# Altium footprint library Reflow3D1411sep.PcbLib: 657 footprints (part 32 of 42)
Each footprint in its own frame and in the unit in brackets; x right, y up, seen from the top. Pads: shape width x height; smd on the part's side, far side on the other; paste and mask are expansions set on the pad; w line width, h text height; cw(c..) or ccw(c..) is an arc to the next point about the centre after c.
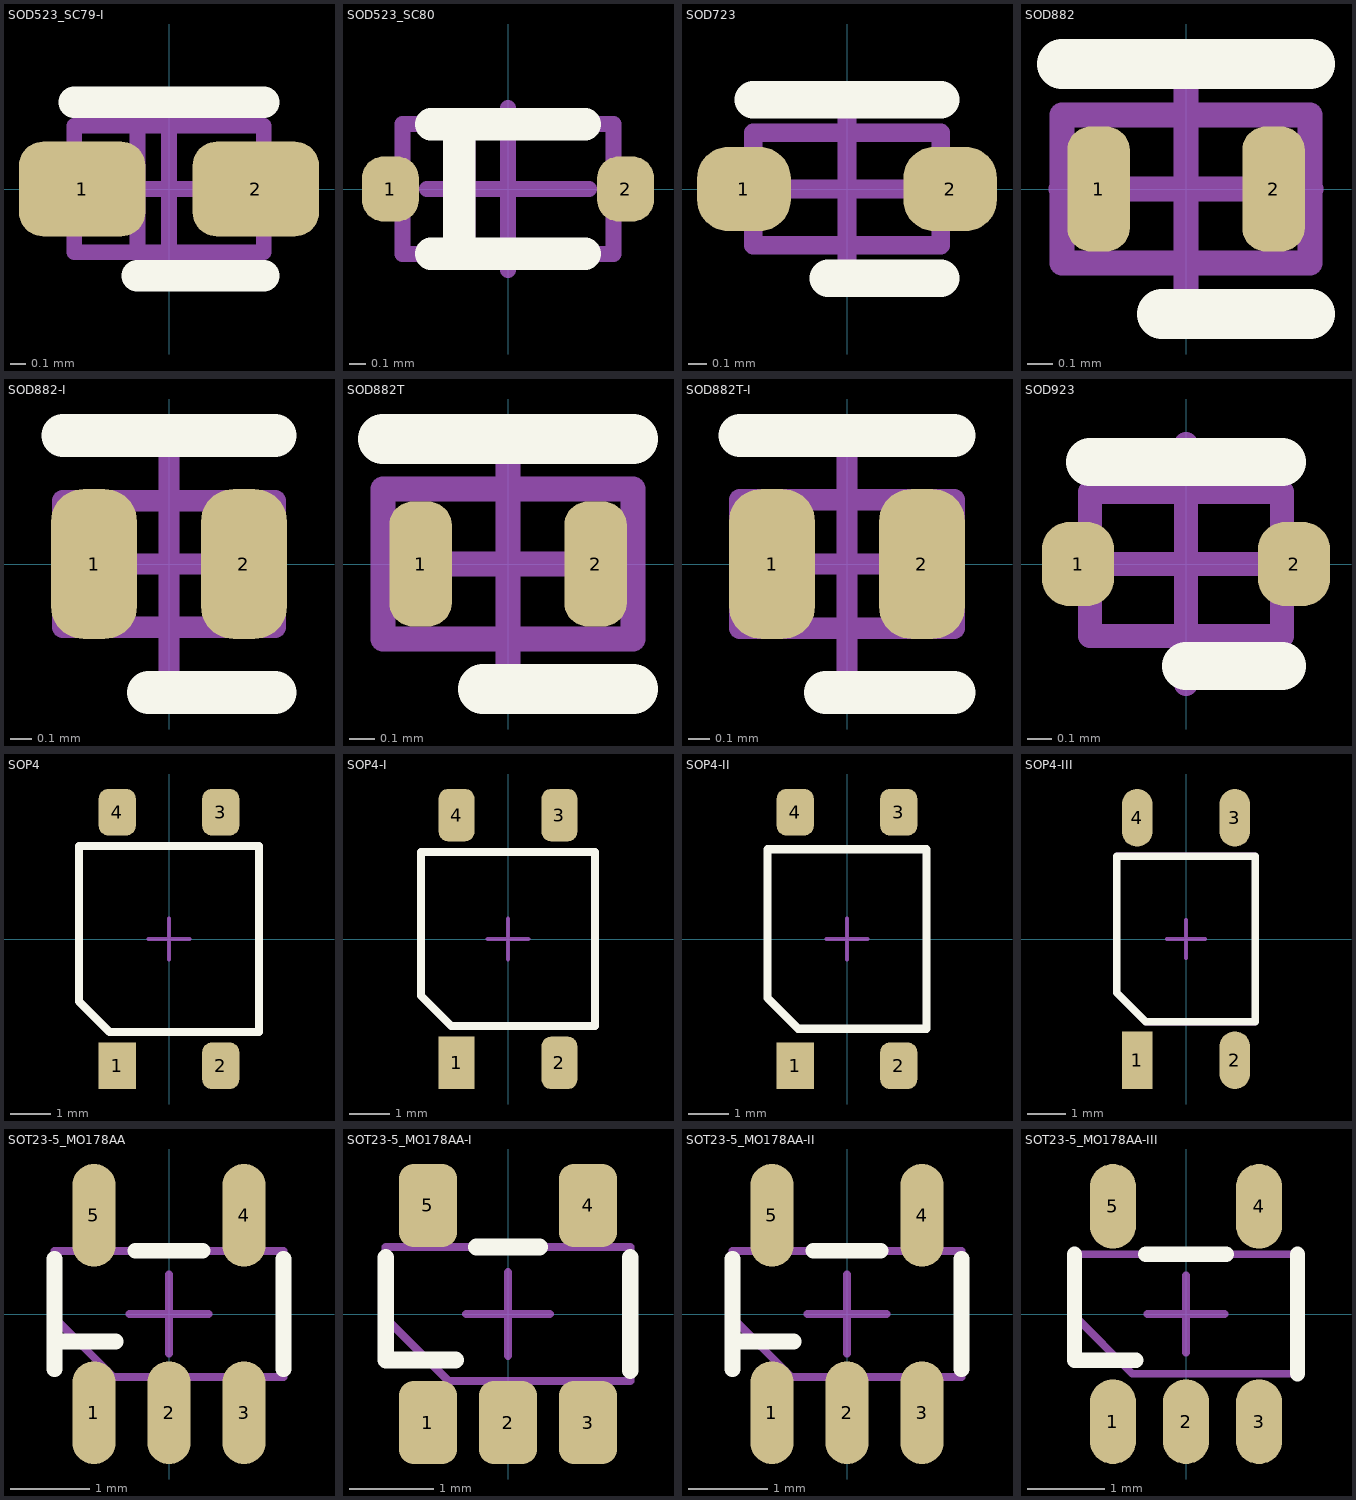
[diagram p31: the footprints below, top view; thin cyan lines are the x and y axes]

## SOD523_SC79-I [mm] "www.nxp.com, sod523_po.pdf, SOD523_fr.pdf"
height 0.62
pads (2):
  rrect50% 0.8x0.6 smd mask+0.075: 1(-0.55,0) 2(0.55,0)
Top Overlay:
  lines w0.2: -0.6,0.55 0.6,0.55 ; -0.2,-0.55 0.6,-0.55
Mechanical 13:
  lines w0.1: -0.2,-0.4 -0.2,0.4 ; -0.6,-0.4 0.6,-0.4 0.6,0.4 -0.6,0.4 -0.6,-0.4
Mechanical 15:
  lines w0.1: -0.5,0 0.5,0 ; 0,-0.5 0,0.5
3D body: height 0.65, standoff 0, extent -0.625,-0.425 0.625,0.425

## SOD523_SC80 [mm] "www.vishay.com, 85633.pdf; www.infineon.com, SCD80-Package_Overview.pdf"
height 0.7
pads (2):
  rrect75% 0.35x0.4 smd mask+0.075: 1(-0.725,0) 2(0.725,0)
Top Overlay:
  lines w0.2: -0.475,-0.4 0.475,-0.4 ; -0.475,0.4 0.475,0.4 ; -0.3,-0.4 -0.3,0.4
Mechanical 13:
  lines w0.1: -0.25,-0.4 -0.25,0.4 ; -0.65,-0.4 -0.65,0.4 0.65,0.4 0.65,-0.4 -0.65,-0.4
Mechanical 15:
  lines w0.1: -0.5,0 0.5,0 ; 0,-0.5 0,0.5
3D body: height 0.8, standoff 0, extent -0.7,-0.45 0.7,0.45

## SOD723 [mm] "www.onsemi.com, 509AA.PDF"
height 0.52
pads (2):
  rrect75% 0.5x0.45 smd mask+0.075: 1(-0.55,0) 2(0.55,0)
Top Overlay:
  lines w0.2: -0.5,0.475 0.5,0.475 ; -0.1,-0.475 0.5,-0.475
Mechanical 13:
  lines w0.1: -0.5,0 -0.1,0 ; -0.5,-0.3 -0.5,0.3 0.5,0.3 0.5,-0.3 -0.5,-0.3
Mechanical 15:
  lines w0.1: -0.5,0 0.5,0 ; 0,-0.5 0,0.5
3D body: height 0.55, standoff 0, extent -0.525,-0.325 0.525,0.325

## SOD882 [mm] "www.nxp.com, SOD882.pdf; www.vishay.com, vbus051b.pdf"
height 0.48
pads (2):
  rrect75% 0.25x0.5 smd mask+0.05: 1(-0.35,0) 2(0.35,0)
Top Overlay:
  lines w0.2: -0.495,0.5 0.495,0.5 ; -0.095,-0.5 0.495,-0.5
Mechanical 13:
  lines w0.1: -0.495,0 -0.095,0 ; -0.495,-0.295 0.495,-0.295 0.495,0.295 -0.495,0.295 -0.495,-0.295
Mechanical 15:
  lines w0.1: -0.5,0 0.5,0 ; 0,-0.5 0,0.5
3D body: height 0.5, standoff 0, extent -0.51,-0.31 0.51,0.31

## SOD882-I [mm] "www.nxp.com, SOD882.pdf, SOD882_fr.pdf"
height 0.48
pads (2):
  rrect75% 0.4x0.7 smd mask+0.075: 1(-0.35,0) 2(0.35,0)
Top Overlay:
  lines w0.2: -0.495,0.6 0.495,0.6 ; -0.095,-0.6 0.495,-0.6
Mechanical 13:
  lines w0.1: -0.495,0 -0.095,0 ; -0.495,-0.295 -0.495,0.295 0.495,0.295 0.495,-0.295 -0.495,-0.295
Mechanical 15:
  lines w0.1: -0.5,0 0.5,0 ; 0,-0.5 0,0.5
3D body: height 0.5, standoff 0, extent -0.51,-0.31 0.51,0.31

## SOD882T [mm] "www.nxp.com, sod882t_po.pdf; www.vishay.com, vbus051b.pdf"
height 0.38
pads (2):
  rrect75% 0.25x0.5 smd mask+0.05: 1(-0.35,0) 2(0.35,0)
Top Overlay:
  lines w0.2: -0.5,0.5 0.5,0.5 ; -0.1,-0.5 0.5,-0.5
Mechanical 13:
  lines w0.1: -0.5,0 -0.1,0 ; -0.5,-0.3 0.5,-0.3 0.5,0.3 -0.5,0.3 -0.5,-0.3
Mechanical 15:
  lines w0.1: -0.5,0 0.5,0 ; 0,-0.5 0,0.5
3D body: height 0.4, standoff 0, extent -0.525,-0.325 0.525,0.325

## SOD882T-I [mm] "www.nxp.com, sod882t_po.pdf, SOD882_fr.pdf"
height 0.38
pads (2):
  rrect75% 0.4x0.7 smd mask+0.075: 1(-0.35,0) 2(0.35,0)
Top Overlay:
  lines w0.2: -0.5,0.6 0.5,0.6 ; -0.1,-0.6 0.5,-0.6
Mechanical 13:
  lines w0.1: -0.5,0 -0.1,0 ; -0.5,-0.3 0.5,-0.3 0.5,0.3 -0.5,0.3 -0.5,-0.3
Mechanical 15:
  lines w0.1: -0.5,0 0.5,0 ; 0,-0.5 0,0.5
3D body: height 0.4, standoff 0, extent -0.525,-0.325 0.525,0.325

## SOD923 [mm] "www.vishay.com, vcut0714.pdf"
height 0.39
pads (2):
  rrect75% 0.3x0.35 smd mask+0.075: 1(-0.45,0) 2(0.45,0)
Top Overlay:
  lines w0.2: -0.4,0.425 0.4,0.425 ; 0,-0.425 0.4,-0.425
Mechanical 13:
  lines w0.1: -0.4,0 0,0 ; -0.4,-0.3 -0.4,0.3 0.4,0.3 0.4,-0.3 -0.4,-0.3
Mechanical 15:
  lines w0.1: -0.5,0 0.5,0 ; 0,-0.5 0,0.5
3D body: height 0.41, standoff 0, extent -0.425,-0.325 0.425,0.325

## SOP4 [mm] "www.vishay.com, 83686.pdf"
height 2.02
pads (4):
  rect 0.91x1.14 smd mask+0.075: 1(-1.27,-3.11)
  rrect50% 0.91x1.14 smd mask+0.075: 2(1.27,-3.11) 3(1.27,3.11) 4(-1.27,3.11)
Top Overlay:
  lines w0.2: -2.21,-1.535 -2.21,2.285 2.21,2.285 2.21,-2.285 -1.46,-2.285 -2.21,-1.535
Mechanical 13:
  lines w0.1: -2.21,-1.535 -2.21,2.285 2.21,2.285 2.21,-2.285 -1.46,-2.285 -2.21,-1.535
Mechanical 15:
  lines w0.1: -0.5,0 0.5,0 ; 0,-0.5 0,0.5
3D body: height 2.13, standoff 0, extent -2.335,-2.415 2.335,2.415

## SOP4-I [mm] "www.irf.com, 4leadsoppo.pdf"
height 2.01
pads (4):
  rect 0.88x1.29 smd mask+0.075: 1(-1.27,-3.055)
  rrect50% 0.88x1.29 smd mask+0.075: 2(1.27,-3.055) 3(1.27,3.055) 4(-1.27,3.055)
Top Overlay:
  lines w0.2: -2.15,-1.4 -1.4,-2.15 2.15,-2.15 2.15,2.15 -2.15,2.15 -2.15,-1.4
Mechanical 13:
  lines w0.1: -2.15,-1.45 -1.4,-2.2 2.15,-2.2 2.15,2.2 -2.15,2.2 -2.15,-1.45
Mechanical 15:
  lines w0.1: -0.5,0 0.5,0 ; 0,-0.5 0,0.5
3D body: height 2.08, standoff 0, extent -2.25,-2.295 2.25,2.295

## SOP4-II [mm] "www.vishay.com, 83686.pdf;  www.cosmo-ic.com, KPC357NT.pdf"
height 2.4
pads (4):
  rect 0.91x1.14 smd mask+0.075: 1(-1.27,-3.11)
  rrect50% 0.91x1.14 smd mask+0.075: 2(1.27,-3.11) 3(1.27,3.11) 4(-1.27,3.11)
Top Overlay:
  lines w0.2: -1.95,-1.45 -1.95,2.2 1.95,2.2 1.95,-2.2 -1.2,-2.2 -1.95,-1.45
Mechanical 13:
  lines w0.1: -1.95,-1.45 -1.95,2.2 1.95,2.2 1.95,-2.2 -1.2,-2.2 -1.95,-1.45
Mechanical 15:
  lines w0.1: -0.5,0 0.5,0 ; 0,-0.5 0,0.5
3D body: height 3, standoff 0, extent -2.2,-2.45 2.2,2.45

## SOP4-III [mm] "sharp-world.com, pc357n_e.pdf"
height 2.7
pads (4):
  rect 0.8x1.5 smd mask+0.075: 1(-1.27,-3.15)
  oval 0.8x1.5 smd mask+0.075: 2(1.27,-3.15) 3(1.27,3.15) 4(-1.27,3.15)
Top Overlay:
  lines w0.2: -1.8,-1.4 -1.05,-2.15 1.8,-2.15 1.8,2.15 -1.8,2.15 -1.8,-1.4
Mechanical 13:
  lines w0.1: -1.8,-1.45 -1.8,2.2 1.8,2.2 1.8,-2.2 -1.05,-2.2 -1.8,-1.45
Mechanical 15:
  lines w0.1: -0.5,0 0.5,0 ; 0,-0.5 0,0.5
3D body: height 3, standoff 0, extent -1.95,-2.3 1.95,2.3

## SOT23-5_MO178AA [mm] "www.maxim-ic.com, 21-0057.PDF, 90-0174.PDF; www.jedec.org, Mo-178c.PDF"
height 1.25
pads (5):
  oval 0.55x1.3 smd mask+0.075: 1(-0.95,-1.25) 2(0,-1.25) 3(0.95,-1.25) 4(0.95,1.25) 5(-0.95,1.25)
Top Overlay:
  lines w0.2: -1.45,-0.7 -1.45,0.7 ; -1.45,-0.35 -0.675,-0.35 ; -0.425,0.8 0.425,0.8 ; 1.45,-0.7 1.45,0.7
Mechanical 13:
  lines w0.1: -1.45,-0.05 -0.7,-0.8 1.45,-0.8 1.45,0.8 -1.45,0.8 -1.45,-0.05
Mechanical 15:
  lines w0.1: -0.5,0 0.5,0 ; 0,-0.5 0,0.5
3D body: height 1.45, standoff 0, extent -1.5,-0.875 1.5,0.875

## SOT23-5_MO178AA-I [mm] "www.national.com, mf05a.pdf"
height 1.08
pads (5):
  rrect50% 0.69x0.99 smd mask+0.05: 1(-0.955,-1.295) 2(0,-1.295) 3(0.955,-1.295) 4(0.955,1.295) 5(-0.955,1.295)
Top Overlay:
  lines w0.2: -1.46,0.675 -1.46,-0.55 -0.625,-0.55 ; -0.375,0.8 0.375,0.8 ; 1.46,-0.675 1.46,0.675
Mechanical 13:
  lines w0.1: -1.46,-0.05 -0.71,-0.8 1.46,-0.8 1.46,0.8 -1.46,0.8 -1.46,-0.05
Mechanical 15:
  lines w0.1: -0.5,0 0.5,0 ; 0,-0.5 0,0.5
3D body: height 1.19, standoff 0, extent -1.495,-0.835 1.495,0.835

## SOT23-5_MO178AA-II [mm] "www.maxim-ic.com, 90-0174.PDF; www.nxp.com, SOT23-5.pdf"
height 1.2
pads (5):
  oval 0.55x1.3 smd mask+0.075: 1(-0.95,-1.25) 2(0,-1.25) 3(0.95,-1.25) 4(0.95,1.25) 5(-0.95,1.25)
Top Overlay:
  lines w0.2: -1.45,-0.7 -1.45,0.7 ; -1.45,-0.35 -0.675,-0.35 ; -0.425,0.8 0.425,0.8 ; 1.45,-0.7 1.45,0.7
Mechanical 13:
  lines w0.1: -1.45,-0.05 -0.7,-0.8 1.45,-0.8 1.45,0.8 -1.45,0.8 -1.45,-0.05
Mechanical 15:
  lines w0.1: -0.5,0 0.5,0 ; 0,-0.5 0,0.5
3D body: height 1.35, standoff 0, extent -1.55,-0.85 1.55,0.85

## SOT23-5_MO178AA-III [mm] "www.microchip.com, en012702.pdf"
height 1.18
pads (5):
  oval 0.6x1.1 smd mask+0.075: 1(-0.95,-1.4) 2(0,-1.4) 3(0.95,-1.4) 4(0.95,1.4) 5(-0.95,1.4)
Top Overlay:
  lines w0.2: -1.45,0.775 -1.45,-0.6 -0.65,-0.6 ; -0.525,0.775 0.525,0.775 ; 1.45,-0.775 1.45,0.775
Mechanical 13:
  lines w0.1: -1.45,-0.025 -1.45,0.775 1.45,0.775 1.45,-0.775 -0.7,-0.775 -1.45,-0.025
Mechanical 15:
  lines w0.1: -0.5,0 0.5,0 ; 0,-0.5 0,0.5
3D body: height 1.45, standoff 0, extent -1.55,-0.9 1.55,0.9